# Altium footprint library FootprintHole.PcbLib: 100 footprints (part 6 of 7)
Each footprint in its own frame and in the unit in brackets; x right, y up, seen from the top. Pads: shape width x height; smd on the part's side, far side on the other; paste and mask are expansions set on the pad; w line width, h text height; cw(c..) or ccw(c..) is an arc to the next point about the centre after c.
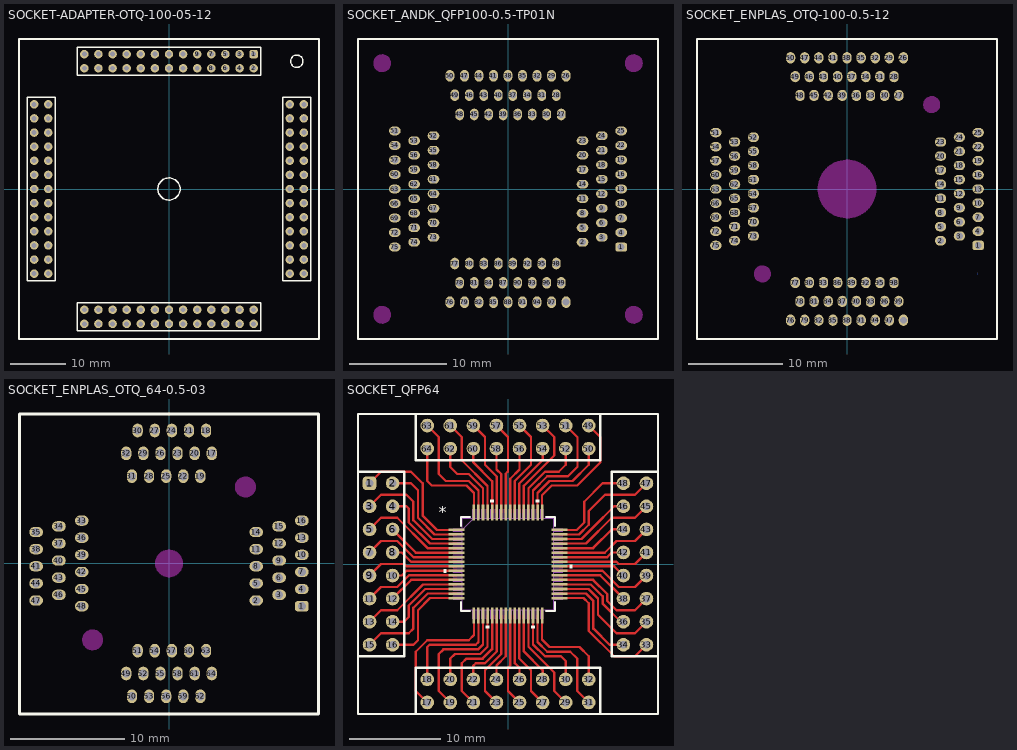
[diagram p5: the footprints below, top view; thin cyan lines are the x and y axes]

## SOCKET-ADAPTER-OTQ-100-05-12 [mil]
pads (104):
  rrect50% 60x60 hole 35: 1(599.99,955.52)
  round 60 hole 35: 2(599.99,855.52) 3(500,955.51) 4(500,855.51) 5(400,955.51) 6(400,855.51) 7(300,955.51) 8(300,855.51) 9(200,955.51) 10(200,855.51) 11(100,955.51) 12(100,855.51) 13(0,955.51) 14(0,855.51) 15(-100,955.51) 16(-100,855.51) 17(-200,955.51) 18(-200,855.51) 19(-300,955.51) 20(-300,855.51) 21(-400,955.51) 22(-400,855.51) 23(-499.99,955.51) 24(-499.99,855.51) 25(-599.99,955.51) 26(-855.52,599.99) 27(-955.51,500) 28(-855.51,500) 29(-955.51,400) 30(-855.51,400) 31(-955.51,300) 32(-855.51,300) 33(-955.51,200) 34(-855.51,200) 35(-955.51,100) 36(-855.51,100) 37(-955.51,0) 38(-855.51,0) 39(-955.51,-100) 40(-855.51,-100) 41(-955.51,-200) 42(-855.51,-200) 43(-955.51,-300) 44(-855.51,-300) 45(-955.51,-400) 46(-855.51,-400) 47(-955.51,-499.99) 48(-855.51,-499.99) 49(-955.51,-599.99) 50(-855.51,-599.99) 51(-599.99,-955.52) 52(-599.99,-855.52) 53(-500,-955.51) 54(-500,-855.51) 55(-400,-955.51) 56(-400,-855.51) 57(-300,-955.51) 58(-300,-855.51) 59(-200,-955.51) 60(-200,-855.51) 61(-100,-955.51) 62(-100,-855.51) 63(0,-955.51) 64(0,-855.51) 65(100,-955.51) 66(100,-855.51) 67(200,-955.51) 68(200,-855.51) 69(300,-955.51) 70(300,-855.51) 71(400,-955.51) 72(400,-855.51) 73(499.99,-955.51) 74(499.99,-855.51) 75(599.99,-955.51) 76(855.52,-599.99) 77(955.51,-500) 78(855.51,-500) 79(955.51,-400) 80(855.51,-400) 81(955.51,-300) 82(855.51,-300) 83(955.51,-200) 84(855.51,-200) 85(955.51,-100) 86(855.51,-100) 87(955.51,0) 88(855.51,0) 89(955.51,100) 90(855.51,100) 91(955.51,200) 92(855.51,200) 93(955.51,300) 94(855.51,300) 95(955.51,400) 96(855.51,400) 97(955.51,499.99) 98(855.51,499.99) 99(955.51,599.99) 100(855.51,599.99) 101(-599.99,855.51) 102(-955.52,599.99) 103(599.99,-855.51) 104(955.52,-599.99)
Top Overlay:
  circle w10: c0,0 r78.74
  circle w10: c905.51,905.51 r44.02
  lines w10: -805.51,650 -805.51,649.99 ; -805.51,650 -1005.51,650 -1005.51,-649.97 -805.51,-649.97 -805.51,649.99 ; -650,-805.51 -649.99,-805.51 ; -649.99,-805.51 649.97,-805.51 649.97,-1005.51 -650,-1005.51 -650,-805.51 ; 650,805.51 650,1005.51 -649.97,1005.51 -649.97,805.51 649.99,805.51 ; 649.99,805.51 650,805.51 ; 805.51,-649.99 805.51,-650 ; 805.51,-649.99 805.51,649.97 1005.51,649.97 1005.51,-650 805.51,-650
  lines w11.81: -1062.99,-1062.99 1062.99,-1062.99 1062.99,1062.99 -1062.99,1062.99 -1062.99,-1062.99
3D body "zl201-1_p2-54_l2-54_w2-54_h8-89.stp": height 350, standoff -120, extent -49.99,805.51 50.01,905.51
3D body "zl201-1_p2-54_l2-54_w2-54_h8-89.stp": height 350, standoff -120, extent -149.99,805.51 -49.99,905.51
3D body "zl201-1_p2-54_l2-54_w2-54_h8-89.stp": height 350, standoff -120, extent 50.01,805.51 150.01,905.51
3D body "zl201-1_p2-54_l2-54_w2-54_h8-89.stp": height 350, standoff -120, extent 150.01,805.51 250.01,905.51
3D body "zl201-1_p2-54_l2-54_w2-54_h8-89.stp": height 350, standoff -120, extent 250.01,805.51 350.01,905.51
3D body "zl201-1_p2-54_l2-54_w2-54_h8-89.stp": height 350, standoff -120, extent 350.01,805.51 450.01,905.51
3D body "zl201-1_p2-54_l2-54_w2-54_h8-89.stp": height 350, standoff -120, extent -149.99,905.51 -49.99,1005.51
3D body "zl201-1_p2-54_l2-54_w2-54_h8-89.stp": height 350, standoff -120, extent -49.99,905.51 50.01,1005.51
3D body "zl201-1_p2-54_l2-54_w2-54_h8-89.stp": height 350, standoff -120, extent 50.01,905.51 150.01,1005.51
3D body "zl201-1_p2-54_l2-54_w2-54_h8-89.stp": height 350, standoff -120, extent 150.01,905.51 250.01,1005.51
3D body "zl201-1_p2-54_l2-54_w2-54_h8-89.stp": height 350, standoff -120, extent 250.01,905.51 350.01,1005.51
3D body "zl201-1_p2-54_l2-54_w2-54_h8-89.stp": height 350, standoff -120, extent 350.02,905.51 450.02,1005.51
3D body "zl201-1_p2-54_l2-54_w2-54_h8-89.stp": height 350, standoff -120, extent 450.01,805.51 550.01,905.51
3D body "zl201-1_p2-54_l2-54_w2-54_h8-89.stp": height 350, standoff -120, extent 450.01,905.51 550.01,1005.51
3D body "zl201-1_p2-54_l2-54_w2-54_h8-89.stp": height 350, standoff -120, extent 550,805.51 650,905.51
3D body "zl201-1_p2-54_l2-54_w2-54_h8-89.stp": height 350, standoff -120, extent 550,905.51 650,1005.51
3D body "zl201-1_p2-54_l2-54_w2-54_h8-89.stp": height 350, standoff -120, extent -249.99,905.51 -149.99,1005.51
3D body "zl201-1_p2-54_l2-54_w2-54_h8-89.stp": height 350, standoff -120, extent -249.99,805.51 -149.99,905.51
3D body "zl201-1_p2-54_l2-54_w2-54_h8-89.stp": height 350, standoff -120, extent -349.99,905.51 -249.99,1005.51
3D body "zl201-1_p2-54_l2-54_w2-54_h8-89.stp": height 350, standoff -120, extent -349.99,805.51 -249.99,905.51
3D body "zl201-1_p2-54_l2-54_w2-54_h8-89.stp": height 350, standoff -120, extent -449.99,905.51 -349.99,1005.51
3D body "zl201-1_p2-54_l2-54_w2-54_h8-89.stp": height 350, standoff -120, extent -449.99,805.51 -349.99,905.51
3D body "zl201-1_p2-54_l2-54_w2-54_h8-89.stp": height 350, standoff -120, extent -549.97,805.5 -449.97,905.5
3D body "zl201-1_p2-54_l2-54_w2-54_h8-89.stp": height 350, standoff -120, extent -549.97,905.51 -449.97,1005.51
3D body "zl201-1_p2-54_l2-54_w2-54_h8-89.stp": height 350, standoff -120, extent -649.97,805.51 -549.97,905.51
3D body "zl201-1_p2-54_l2-54_w2-54_h8-89.stp": height 350, standoff -120, extent -649.97,905.51 -549.97,1005.51
3D body "zl201-1_p2-54_l2-54_w2-54_h8-89.stp": height 350, standoff -120, extent -905.51,-49.99 -805.51,50.01
3D body "zl201-1_p2-54_l2-54_w2-54_h8-89.stp": height 350, standoff -120, extent -905.51,-149.99 -805.51,-49.99
3D body "zl201-1_p2-54_l2-54_w2-54_h8-89.stp": height 350, standoff -120, extent -905.51,50.01 -805.51,150.01
3D body "zl201-1_p2-54_l2-54_w2-54_h8-89.stp": height 350, standoff -120, extent -905.51,150.01 -805.51,250.01
3D body "zl201-1_p2-54_l2-54_w2-54_h8-89.stp": height 350, standoff -120, extent -905.51,250.01 -805.51,350.01
3D body "zl201-1_p2-54_l2-54_w2-54_h8-89.stp": height 350, standoff -120, extent -905.51,350.01 -805.51,450.01
3D body "zl201-1_p2-54_l2-54_w2-54_h8-89.stp": height 350, standoff -120, extent -1005.51,-149.99 -905.51,-49.99
3D body "zl201-1_p2-54_l2-54_w2-54_h8-89.stp": height 350, standoff -120, extent -1005.51,-49.99 -905.51,50.01
3D body "zl201-1_p2-54_l2-54_w2-54_h8-89.stp": height 350, standoff -120, extent -1005.51,50.01 -905.51,150.01
3D body "zl201-1_p2-54_l2-54_w2-54_h8-89.stp": height 350, standoff -120, extent -1005.51,150.01 -905.51,250.01
3D body "zl201-1_p2-54_l2-54_w2-54_h8-89.stp": height 350, standoff -120, extent -1005.51,250.01 -905.51,350.01
3D body "zl201-1_p2-54_l2-54_w2-54_h8-89.stp": height 350, standoff -120, extent -1005.51,350.02 -905.51,450.02
3D body "zl201-1_p2-54_l2-54_w2-54_h8-89.stp": height 350, standoff -120, extent -905.51,450.01 -805.51,550.01
3D body "zl201-1_p2-54_l2-54_w2-54_h8-89.stp": height 350, standoff -120, extent -1005.51,450.01 -905.51,550.01
3D body "zl201-1_p2-54_l2-54_w2-54_h8-89.stp": height 350, standoff -120, extent -905.51,550 -805.51,650
3D body "zl201-1_p2-54_l2-54_w2-54_h8-89.stp": height 350, standoff -120, extent -1005.51,550 -905.51,650
3D body "zl201-1_p2-54_l2-54_w2-54_h8-89.stp": height 350, standoff -120, extent -1005.51,-249.99 -905.51,-149.99
3D body "zl201-1_p2-54_l2-54_w2-54_h8-89.stp": height 350, standoff -120, extent -905.51,-249.99 -805.51,-149.99
3D body "zl201-1_p2-54_l2-54_w2-54_h8-89.stp": height 350, standoff -120, extent -1005.51,-349.99 -905.51,-249.99
3D body "zl201-1_p2-54_l2-54_w2-54_h8-89.stp": height 350, standoff -120, extent -905.51,-349.99 -805.51,-249.99
3D body "zl201-1_p2-54_l2-54_w2-54_h8-89.stp": height 350, standoff -120, extent -1005.51,-449.99 -905.51,-349.99
3D body "zl201-1_p2-54_l2-54_w2-54_h8-89.stp": height 350, standoff -120, extent -905.51,-449.99 -805.51,-349.99
3D body "zl201-1_p2-54_l2-54_w2-54_h8-89.stp": height 350, standoff -120, extent -905.5,-549.97 -805.5,-449.97
3D body "zl201-1_p2-54_l2-54_w2-54_h8-89.stp": height 350, standoff -120, extent -1005.51,-549.97 -905.51,-449.97
3D body "zl201-1_p2-54_l2-54_w2-54_h8-89.stp": height 350, standoff -120, extent -905.51,-649.97 -805.51,-549.97
3D body "zl201-1_p2-54_l2-54_w2-54_h8-89.stp": height 350, standoff -120, extent -1005.51,-649.97 -905.51,-549.97
3D body "zl201-1_p2-54_l2-54_w2-54_h8-89.stp": height 350, standoff -120, extent 549.97,-1005.51 649.97,-905.51
3D body "zl201-1_p2-54_l2-54_w2-54_h8-89.stp": height 350, standoff -120, extent 549.97,-905.51 649.97,-805.51
3D body "zl201-1_p2-54_l2-54_w2-54_h8-89.stp": height 350, standoff -120, extent 449.97,-1005.51 549.97,-905.51
3D body "zl201-1_p2-54_l2-54_w2-54_h8-89.stp": height 350, standoff -120, extent 449.97,-905.5 549.97,-805.5
3D body "zl201-1_p2-54_l2-54_w2-54_h8-89.stp": height 350, standoff -120, extent 349.99,-905.51 449.99,-805.51
3D body "zl201-1_p2-54_l2-54_w2-54_h8-89.stp": height 350, standoff -120, extent 349.99,-1005.51 449.99,-905.51
3D body "zl201-1_p2-54_l2-54_w2-54_h8-89.stp": height 350, standoff -120, extent 249.99,-905.51 349.99,-805.51
3D body "zl201-1_p2-54_l2-54_w2-54_h8-89.stp": height 350, standoff -120, extent 249.99,-1005.51 349.99,-905.51
3D body "zl201-1_p2-54_l2-54_w2-54_h8-89.stp": height 350, standoff -120, extent 149.99,-905.51 249.99,-805.51
3D body "zl201-1_p2-54_l2-54_w2-54_h8-89.stp": height 350, standoff -120, extent 149.99,-1005.51 249.99,-905.51
3D body "zl201-1_p2-54_l2-54_w2-54_h8-89.stp": height 350, standoff -120, extent -650,-1005.51 -550,-905.51
3D body "zl201-1_p2-54_l2-54_w2-54_h8-89.stp": height 350, standoff -120, extent -650,-905.51 -550,-805.51
3D body "zl201-1_p2-54_l2-54_w2-54_h8-89.stp": height 350, standoff -120, extent -550.01,-1005.51 -450.01,-905.51
3D body "zl201-1_p2-54_l2-54_w2-54_h8-89.stp": height 350, standoff -120, extent -550.01,-905.51 -450.01,-805.51
3D body "zl201-1_p2-54_l2-54_w2-54_h8-89.stp": height 350, standoff -120, extent -450.02,-1005.51 -350.02,-905.51
3D body "zl201-1_p2-54_l2-54_w2-54_h8-89.stp": height 350, standoff -120, extent -350.01,-1005.51 -250.01,-905.51
3D body "zl201-1_p2-54_l2-54_w2-54_h8-89.stp": height 350, standoff -120, extent -250.01,-1005.51 -150.01,-905.51
3D body "zl201-1_p2-54_l2-54_w2-54_h8-89.stp": height 350, standoff -120, extent -150.01,-1005.51 -50.01,-905.51
3D body "zl201-1_p2-54_l2-54_w2-54_h8-89.stp": height 350, standoff -120, extent -50.01,-1005.51 49.99,-905.51
3D body "zl201-1_p2-54_l2-54_w2-54_h8-89.stp": height 350, standoff -120, extent 49.99,-1005.51 149.99,-905.51
3D body "zl201-1_p2-54_l2-54_w2-54_h8-89.stp": height 350, standoff -120, extent -450.01,-905.51 -350.01,-805.51
3D body "zl201-1_p2-54_l2-54_w2-54_h8-89.stp": height 350, standoff -120, extent -350.01,-905.51 -250.01,-805.51
3D body "zl201-1_p2-54_l2-54_w2-54_h8-89.stp": height 350, standoff -120, extent -250.01,-905.51 -150.01,-805.51
3D body "zl201-1_p2-54_l2-54_w2-54_h8-89.stp": height 350, standoff -120, extent -150.01,-905.51 -50.01,-805.51
3D body "zl201-1_p2-54_l2-54_w2-54_h8-89.stp": height 350, standoff -120, extent 49.99,-905.51 149.99,-805.51
3D body "zl201-1_p2-54_l2-54_w2-54_h8-89.stp": height 350, standoff -120, extent -50.01,-905.51 49.99,-805.51
3D body "zl201-1_p2-54_l2-54_w2-54_h8-89.stp": height 350, standoff -120, extent 905.51,549.97 1005.51,649.97
3D body "zl201-1_p2-54_l2-54_w2-54_h8-89.stp": height 350, standoff -120, extent 805.51,549.97 905.51,649.97
3D body "zl201-1_p2-54_l2-54_w2-54_h8-89.stp": height 350, standoff -120, extent 905.51,449.97 1005.51,549.97
3D body "zl201-1_p2-54_l2-54_w2-54_h8-89.stp": height 350, standoff -120, extent 805.5,449.97 905.5,549.97
3D body "zl201-1_p2-54_l2-54_w2-54_h8-89.stp": height 350, standoff -120, extent 805.51,349.99 905.51,449.99
3D body "zl201-1_p2-54_l2-54_w2-54_h8-89.stp": height 350, standoff -120, extent 905.51,349.99 1005.51,449.99
3D body "zl201-1_p2-54_l2-54_w2-54_h8-89.stp": height 350, standoff -120, extent 805.51,249.99 905.51,349.99
3D body "zl201-1_p2-54_l2-54_w2-54_h8-89.stp": height 350, standoff -120, extent 905.51,249.99 1005.51,349.99
3D body "zl201-1_p2-54_l2-54_w2-54_h8-89.stp": height 350, standoff -120, extent 805.51,149.99 905.51,249.99
3D body "zl201-1_p2-54_l2-54_w2-54_h8-89.stp": height 350, standoff -120, extent 905.51,149.99 1005.51,249.99
3D body "zl201-1_p2-54_l2-54_w2-54_h8-89.stp": height 350, standoff -120, extent 905.51,-650 1005.51,-550
3D body "zl201-1_p2-54_l2-54_w2-54_h8-89.stp": height 350, standoff -120, extent 805.51,-650 905.51,-550
3D body "zl201-1_p2-54_l2-54_w2-54_h8-89.stp": height 350, standoff -120, extent 905.51,-550.01 1005.51,-450.01
3D body "zl201-1_p2-54_l2-54_w2-54_h8-89.stp": height 350, standoff -120, extent 805.51,-550.01 905.51,-450.01
3D body "zl201-1_p2-54_l2-54_w2-54_h8-89.stp": height 350, standoff -120, extent 905.51,-450.02 1005.51,-350.02
3D body "zl201-1_p2-54_l2-54_w2-54_h8-89.stp": height 350, standoff -120, extent 905.51,-350.01 1005.51,-250.01
3D body "zl201-1_p2-54_l2-54_w2-54_h8-89.stp": height 350, standoff -120, extent 905.51,-250.01 1005.51,-150.01
3D body "zl201-1_p2-54_l2-54_w2-54_h8-89.stp": height 350, standoff -120, extent 905.51,-150.01 1005.51,-50.01
3D body "zl201-1_p2-54_l2-54_w2-54_h8-89.stp": height 350, standoff -120, extent 905.51,-50.01 1005.51,49.99
3D body "zl201-1_p2-54_l2-54_w2-54_h8-89.stp": height 350, standoff -120, extent 905.51,49.99 1005.51,149.99
3D body "zl201-1_p2-54_l2-54_w2-54_h8-89.stp": height 350, standoff -120, extent 805.51,-450.01 905.51,-350.01
3D body "zl201-1_p2-54_l2-54_w2-54_h8-89.stp": height 350, standoff -120, extent 805.51,-350.01 905.51,-250.01
3D body "zl201-1_p2-54_l2-54_w2-54_h8-89.stp": height 350, standoff -120, extent 805.51,-250.01 905.51,-150.01
3D body "zl201-1_p2-54_l2-54_w2-54_h8-89.stp": height 350, standoff -120, extent 805.51,-150.01 905.51,-50.01
3D body "zl201-1_p2-54_l2-54_w2-54_h8-89.stp": height 350, standoff -120, extent 805.51,49.99 905.51,149.99
3D body "zl201-1_p2-54_l2-54_w2-54_h8-89.stp": height 350, standoff -120, extent 805.51,-50.01 905.51,49.99

## SOCKET_ANDK_QFP100-0.5-TP01N [mm]
pads (100):
  rrect50% 1.2x0.9 hole 0.72: 1(11.7,-6)
  oval 1.2x0.9 hole 0.72: 2(7.7,-5.5) 3(9.7,-5) 4(11.7,-4.5) 5(7.7,-4) 6(9.7,-3.5) 7(11.7,-3) 8(7.7,-2.5) 9(9.7,-2) 10(11.7,-1.5) 11(7.7,-1) 12(9.7,-0.5) 13(11.7,0) 14(7.7,0.5) 15(9.7,1) 16(11.7,1.5) 17(7.7,2) 18(9.7,2.5) 19(11.7,3) 20(7.7,3.5) 21(9.7,4) 22(11.7,4.5) 23(7.7,5) 24(9.7,5.5) 25(11.7,6) 51(-11.7,6) 52(-7.7,5.5) 53(-9.7,5) 54(-11.7,4.5) 55(-7.7,4) 56(-9.7,3.5) 57(-11.7,3) 58(-7.7,2.5) 59(-9.7,2) 60(-11.7,1.5) 61(-7.7,1) 62(-9.7,0.5) 63(-11.7,0) 64(-7.7,-0.5) 65(-9.7,-1) 66(-11.7,-1.5) 67(-7.7,-2) 68(-9.7,-2.5) 69(-11.7,-3) 70(-7.7,-3.5) 71(-9.7,-4) 72(-11.7,-4.5) 73(-7.7,-5) 74(-9.7,-5.5) 75(-11.7,-6)
  oval 0.9x1.2 hole 0.72: 26(6,11.7) 27(5.5,7.7) 28(5,9.7) 29(4.5,11.7) 30(4,7.7) 31(3.5,9.7) 32(3,11.7) 33(2.5,7.7) 34(2,9.7) 35(1.5,11.7) 36(1,7.7) 37(0.5,9.7) 38(0,11.7) 39(-0.5,7.7) 40(-1,9.7) 41(-1.5,11.7) 42(-2,7.7) 43(-2.5,9.7) 44(-3,11.7) 45(-3.5,7.7) 46(-4,9.7) 47(-4.5,11.7) 48(-5,7.7) 49(-5.5,9.7) 50(-6,11.7) 76(-6,-11.7) 77(-5.5,-7.7) 78(-5,-9.7) 79(-4.5,-11.7) 80(-4,-7.7) 81(-3.5,-9.7) 82(-3,-11.7) 83(-2.5,-7.7) 84(-2,-9.7) 85(-1.5,-11.7) 86(-1,-7.7) 87(-0.5,-9.7) 88(0,-11.7) 89(0.5,-7.7) 90(1,-9.7) 91(1.5,-11.7) 92(2,-7.7) 93(2.5,-9.7) 94(3,-11.7) 95(3.5,-7.7) 96(4,-9.7) 97(4.5,-11.7) 98(5,-7.7) 99(5.5,-9.7) 100(6,-11.7)
Top Overlay:
  lines w0.254: -15.5,-15.5 -15.5,15.5 15.5,15.5 15.5,-15.5 -15.5,-15.5
Keep-Out Layer:
  board cut-out: -13,-13.8 -13.079,-13.8 -13.233,-13.769 -13.379,-13.709 -13.51,-13.621 -13.621,-13.51 -13.709,-13.379 -13.769,-13.233 -13.8,-13.079 -13.8,-13 -13.8,-12.921 -13.769,-12.767 -13.709,-12.621 -13.621,-12.49 -13.51,-12.379 -13.379,-12.291 -13.233,-12.231 -13.079,-12.2 -13,-12.2 -12.921,-12.2 -12.767,-12.231 -12.621,-12.291 -12.49,-12.379 -12.379,-12.49 -12.291,-12.621 -12.231,-12.767 -12.2,-12.921 -12.2,-13 -12.2,-13.079 -12.231,-13.233 -12.291,-13.379 -12.379,-13.51 -12.49,-13.621 -12.621,-13.709 -12.767,-13.769 -12.921,-13.8
  board cut-out: 12.2,-13 12.2,-13.079 12.231,-13.233 12.291,-13.379 12.379,-13.51 12.49,-13.621 12.621,-13.709 12.767,-13.769 12.921,-13.8 13,-13.8 13.079,-13.8 13.233,-13.769 13.379,-13.709 13.51,-13.621 13.621,-13.51 13.709,-13.379 13.769,-13.233 13.8,-13.079 13.8,-13 13.8,-12.921 13.769,-12.767 13.709,-12.621 13.621,-12.49 13.51,-12.379 13.379,-12.291 13.233,-12.231 13.079,-12.2 13,-12.2 12.921,-12.2 12.767,-12.231 12.621,-12.291 12.49,-12.379 12.379,-12.49 12.291,-12.621 12.231,-12.767 12.2,-12.921
  board cut-out: 13,12.2 12.921,12.2 12.767,12.231 12.621,12.291 12.49,12.379 12.379,12.49 12.291,12.621 12.231,12.767 12.2,12.921 12.2,13 12.2,13.079 12.231,13.233 12.291,13.379 12.379,13.51 12.49,13.621 12.621,13.709 12.767,13.769 12.921,13.8 13,13.8 13.079,13.8 13.233,13.769 13.379,13.709 13.51,13.621 13.621,13.51 13.709,13.379 13.769,13.233 13.8,13.079 13.8,13 13.8,12.921 13.769,12.767 13.709,12.621 13.621,12.49 13.51,12.379 13.379,12.291 13.233,12.231 13.079,12.2
  board cut-out: -13,12.2 -13.079,12.2 -13.233,12.231 -13.379,12.291 -13.51,12.379 -13.621,12.49 -13.709,12.621 -13.769,12.767 -13.8,12.921 -13.8,13 -13.8,13.079 -13.769,13.233 -13.709,13.379 -13.621,13.51 -13.51,13.621 -13.379,13.709 -13.233,13.769 -13.079,13.8 -13,13.8 -12.921,13.8 -12.767,13.769 -12.621,13.709 -12.49,13.621 -12.379,13.51 -12.291,13.379 -12.231,13.233 -12.2,13.079 -12.2,13 -12.2,12.921 -12.231,12.767 -12.291,12.621 -12.379,12.49 -12.49,12.379 -12.621,12.291 -12.767,12.231 -12.921,12.2
Keep-Out Layer:
  circle w0.254: c-13,-13 r0.8
  circle w0.254: c13,-13 r0.8
  circle w0.254: c13,13 r0.8
  circle w0.254: c-13,13 r0.8

## SOCKET_ENPLAS_OTQ-100-0.5-12 [mm]
pads (100):
  rrect50% 1.2x1 hole 0.72: 1(13.95,-6)
  oval 1.2x1 hole 0.72: 2(9.95,-5.5) 3(11.95,-5) 4(13.95,-4.5) 5(9.95,-4) 6(11.95,-3.5) 7(13.95,-3) 8(9.95,-2.5) 9(11.95,-2) 10(13.95,-1.5) 11(9.95,-1) 12(11.95,-0.5) 13(13.95,0) 14(9.95,0.5) 15(11.95,1) 16(13.95,1.5) 17(9.95,2) 18(11.95,2.5) 19(13.95,3) 20(9.95,3.5) 21(11.95,4) 22(13.95,4.5) 23(9.95,5) 24(11.95,5.5) 25(13.95,6) 51(-13.95,6) 52(-9.95,5.5) 53(-11.95,5) 54(-13.95,4.5) 55(-9.95,4) 56(-11.95,3.5) 57(-13.95,3) 58(-9.95,2.5) 59(-11.95,2) 60(-13.95,1.5) 61(-9.95,1) 62(-11.95,0.5) 63(-13.95,0) 64(-9.95,-0.5) 65(-11.95,-1) 66(-13.95,-1.5) 67(-9.95,-2) 68(-11.95,-2.5) 69(-13.95,-3) 70(-9.95,-3.5) 71(-11.95,-4) 72(-13.95,-4.5) 73(-9.95,-5) 74(-11.95,-5.5) 75(-13.95,-6)
  oval 1x1.2 hole 0.72: 26(6,13.95) 27(5.5,9.95) 28(5,11.95) 29(4.5,13.95) 30(4,9.95) 31(3.5,11.95) 32(3,13.95) 33(2.5,9.95) 34(2,11.95) 35(1.5,13.95) 36(1,9.95) 37(0.5,11.95) 38(0,13.95) 39(-0.5,9.95) 40(-1,11.95) 41(-1.5,13.95) 42(-2,9.95) 43(-2.5,11.95) 44(-3,13.95) 45(-3.5,9.95) 46(-4,11.95) 47(-4.5,13.95) 48(-5,9.95) 49(-5.5,11.95) 50(-6,13.95) 76(-6,-13.95) 77(-5.5,-9.95) 78(-5,-11.95) 79(-4.5,-13.95) 80(-4,-9.95) 81(-3.5,-11.95) 82(-3,-13.95) 83(-2.5,-9.95) 84(-2,-11.95) 85(-1.5,-13.95) 86(-1,-9.95) 87(-0.5,-11.95) 88(0,-13.95) 89(0.5,-9.95) 90(1,-11.95) 91(1.5,-13.95) 92(2,-9.95) 93(2.5,-11.95) 94(3,-13.95) 95(3.5,-9.95) 96(4,-11.95) 97(4.5,-13.95) 98(5,-9.95) 99(5.5,-11.95) 100(6,-13.95)
Bottom Layer:
  region: 13.9,-8.889 13.9,-9.139
Top Overlay:
  lines w0.254: -15.95,-15.95 15.95,-15.95 15.95,15.95 -15.95,15.95 -15.95,-15.95
Keep-Out Layer:
  board cut-out: -9,-9.8 -9.079,-9.8 -9.233,-9.769 -9.379,-9.709 -9.51,-9.621 -9.621,-9.51 -9.709,-9.379 -9.769,-9.233 -9.8,-9.079 -9.8,-9 -9.8,-8.921 -9.769,-8.767 -9.709,-8.621 -9.621,-8.49 -9.51,-8.379 -9.379,-8.291 -9.233,-8.231 -9.079,-8.2 -9,-8.2 -8.921,-8.2 -8.767,-8.231 -8.621,-8.291 -8.49,-8.379 -8.379,-8.49 -8.291,-8.621 -8.231,-8.767 -8.2,-8.921 -8.2,-9 -8.2,-9.079 -8.231,-9.233 -8.291,-9.379 -8.379,-9.51 -8.49,-9.621 -8.621,-9.709 -8.767,-9.769 -8.921,-9.8
  board cut-out: 0,-3 -0.197,-3 -0.587,-2.949 -0.966,-2.847 -1.33,-2.696 -1.67,-2.5 -1.982,-2.26 -2.26,-1.982 -2.5,-1.67 -2.696,-1.33 -2.847,-0.966 -2.949,-0.587 -3,-0.197 -3,0 -3,0.197 -2.949,0.587 -2.847,0.966 -2.696,1.33 -2.5,1.67 -2.26,1.982 -1.982,2.26 -1.67,2.5 -1.33,2.696 -0.966,2.847 -0.587,2.949 -0.197,3 0,3 0.197,3 0.587,2.949 0.966,2.847 1.33,2.696 1.67,2.5 1.982,2.26 2.26,1.982 2.5,1.67 2.696,1.33 2.847,0.966 2.949,0.587 3,0.197 3,0 3,-0.197 2.949,-0.587 2.847,-0.966 2.696,-1.33 2.5,-1.67 2.26,-1.982 1.982,-2.26 1.67,-2.5 1.33,-2.696 0.966,-2.847 0.587,-2.949 0.197,-3
  board cut-out: 9,8.2 8.921,8.2 8.767,8.231 8.621,8.291 8.49,8.379 8.379,8.49 8.291,8.621 8.231,8.767 8.2,8.921 8.2,9 8.2,9.079 8.231,9.233 8.291,9.379 8.379,9.51 8.49,9.621 8.621,9.709 8.767,9.769 8.921,9.8 9,9.8 9.079,9.8 9.233,9.769 9.379,9.709 9.51,9.621 9.621,9.51 9.709,9.379 9.769,9.233 9.8,9.079 9.8,9 9.8,8.921 9.769,8.767 9.709,8.621 9.621,8.49 9.51,8.379 9.379,8.291 9.233,8.231 9.079,8.2
Keep-Out Layer:
  circle w0.254: c0,0 r3
  circle w0.254: c-9,-9.025 r0.786
  circle w0.254: c9,8.975 r0.786

## SOCKET_ENPLAS_OTQ_64-0.5-03 [mm]
pads (64):
  rrect50% 1.2x0.9 hole 0.72: 1(11.65,-3.75)
  oval 1.2x0.9 hole 0.72: 2(7.65,-3.25) 3(9.65,-2.75) 4(11.65,-2.25) 5(7.65,-1.75) 6(9.65,-1.25) 7(11.65,-0.75) 8(7.65,-0.25) 9(9.65,0.25) 10(11.65,0.75) 11(7.65,1.25) 12(9.65,1.75) 13(11.65,2.25) 14(7.65,2.75) 15(9.65,3.25) 16(11.65,3.75) 33(-7.65,3.75) 34(-9.65,3.25) 35(-11.65,2.75) 36(-7.65,2.25) 37(-9.65,1.75) 38(-11.65,1.25) 39(-7.65,0.75) 40(-9.65,0.25) 41(-11.65,-0.25) 42(-7.65,-0.75) 43(-9.65,-1.25) 44(-11.65,-1.75) 45(-7.65,-2.25) 46(-9.65,-2.75) 47(-11.65,-3.25) 48(-7.65,-3.75)
  oval 0.9x1.2 hole 0.72: 17(3.75,9.65) 18(3.25,11.65) 19(2.75,7.65) 20(2.25,9.65) 21(1.75,11.65) 22(1.25,7.65) 23(0.75,9.65) 24(0.25,11.65) 25(-0.25,7.65) 26(-0.75,9.65) 27(-1.25,11.65) 28(-1.75,7.65) 29(-2.25,9.65) 30(-2.75,11.65) 31(-3.25,7.65) 32(-3.75,9.65) 49(-3.75,-9.65) 50(-3.25,-11.65) 51(-2.75,-7.65) 52(-2.25,-9.65) 53(-1.75,-11.65) 54(-1.25,-7.65) 55(-0.75,-9.65) 56(-0.25,-11.65) 57(0.25,-7.65) 58(0.75,-9.65) 59(1.25,-11.65) 60(1.75,-7.65) 61(2.25,-9.65) 62(2.75,-11.65) 63(3.25,-7.65) 64(3.75,-9.65)
Top Overlay:
  lines w0.254: -13.1,-13.2 -13.1,-11.65 -13.1,13.1 0,13.1 13.1,13.1 13.1,-13.2 -13.1,-13.2
Keep-Out Layer:
  board cut-out: 0,-1.1 -0.108,-1.1 -0.321,-1.058 -0.521,-0.975 -0.701,-0.854 -0.854,-0.701 -0.975,-0.521 -1.058,-0.321 -1.1,-0.108 -1.1,0 -1.1,0.108 -1.058,0.321 -0.975,0.521 -0.854,0.701 -0.701,0.854 -0.521,0.975 -0.321,1.058 -0.108,1.1 0,1.1 0.108,1.1 0.321,1.058 0.521,0.975 0.701,0.854 0.854,0.701 0.975,0.521 1.058,0.321 1.1,0.108 1.1,0 1.1,-0.108 1.058,-0.321 0.975,-0.521 0.854,-0.701 0.701,-0.854 0.521,-0.975 0.321,-1.058 0.108,-1.1
  board cut-out: 6.7,5.9 6.621,5.9 6.467,5.931 6.321,5.991 6.19,6.079 6.079,6.19 5.991,6.321 5.931,6.467 5.9,6.621 5.9,6.7 5.9,6.779 5.931,6.933 5.991,7.079 6.079,7.21 6.19,7.321 6.321,7.409 6.467,7.469 6.621,7.5 6.7,7.5 6.779,7.5 6.933,7.469 7.079,7.409 7.21,7.321 7.321,7.21 7.409,7.079 7.469,6.933 7.5,6.779 7.5,6.7 7.5,6.621 7.469,6.467 7.409,6.321 7.321,6.19 7.21,6.079 7.079,5.991 6.933,5.931 6.779,5.9
  board cut-out: -6.7,-7.5 -6.779,-7.5 -6.933,-7.469 -7.079,-7.409 -7.21,-7.321 -7.321,-7.21 -7.409,-7.079 -7.469,-6.933 -7.5,-6.779 -7.5,-6.7 -7.5,-6.621 -7.469,-6.467 -7.409,-6.321 -7.321,-6.19 -7.21,-6.079 -7.079,-5.991 -6.933,-5.931 -6.779,-5.9 -6.7,-5.9 -6.621,-5.9 -6.467,-5.931 -6.321,-5.991 -6.19,-6.079 -6.079,-6.19 -5.991,-6.321 -5.931,-6.467 -5.9,-6.621 -5.9,-6.7 -5.9,-6.779 -5.931,-6.933 -5.991,-7.079 -6.079,-7.21 -6.19,-7.321 -6.321,-7.409 -6.467,-7.469 -6.621,-7.5
Keep-Out Layer:
  circle w0.254: c-6.7,-6.7 r0.8
  circle w0.254: c6.7,6.7 r0.8
  circle w0.254: c0,0 r1.1

## SOCKET_QFP64 [mm]
pads (128):
  rrect50% 1.5x1.5 hole 0.85: 1(-15.24,8.89)
  rect 1.778x0.279 smd paste+0 mask+0: 1(-5.677,3.75) 2(-5.677,3.25) 3(-5.677,2.75) 4(-5.677,2.25) 5(-5.677,1.75) 6(-5.677,1.25) 7(-5.677,0.75) 8(-5.677,0.25) 9(-5.677,-0.25) 10(-5.677,-0.75) 11(-5.677,-1.25) 12(-5.677,-1.75) 13(-5.677,-2.25) 14(-5.677,-2.75) 15(-5.677,-3.25) 16(-5.677,-3.75) 33(5.677,-3.75) 34(5.677,-3.25) 35(5.677,-2.75) 36(5.677,-2.25) 37(5.677,-1.75) 38(5.677,-1.25) 39(5.677,-0.75) 40(5.677,-0.25) 41(5.677,0.25) 42(5.677,0.75) 43(5.677,1.25) 44(5.677,1.75) 45(5.677,2.25) 46(5.677,2.75) 47(5.677,3.25) 48(5.677,3.75)
  round 1.5 hole 0.85: 2(-12.7,8.89) 3(-15.24,6.35) 4(-12.7,6.35) 5(-15.24,3.81) 6(-12.7,3.81) 7(-15.24,1.27) 8(-12.7,1.27) 9(-15.24,-1.27) 10(-12.7,-1.27) 11(-15.24,-3.81) 12(-12.7,-3.81) 13(-15.24,-6.35) 14(-12.7,-6.35) 15(-15.24,-8.89) 16(-12.7,-8.89) 17(-8.89,-15.24) 18(-8.89,-12.7) 19(-6.35,-15.24) 20(-6.35,-12.7) 21(-3.81,-15.24) 22(-3.81,-12.7) 23(-1.27,-15.24) 24(-1.27,-12.7) 25(1.27,-15.24) 26(1.27,-12.7) 27(3.81,-15.24) 28(3.81,-12.7) 29(6.35,-15.24) 30(6.35,-12.7) 31(8.89,-15.24) 32(8.89,-12.7) 33(15.24,-8.89) 34(12.7,-8.89) 35(15.24,-6.35) 36(12.7,-6.35) 37(15.24,-3.81) 38(12.7,-3.81) 39(15.24,-1.27) 40(12.7,-1.27) 41(15.24,1.27) 42(12.7,1.27) 43(15.24,3.81) 44(12.7,3.81) 45(15.24,6.35) 46(12.7,6.35) 47(15.24,8.89) 48(12.7,8.89) 49(8.89,15.24) 50(8.89,12.7) 51(6.35,15.24) 52(6.35,12.7) 53(3.81,15.24) 54(3.81,12.7) 55(1.27,15.24) 56(1.27,12.7) 57(-1.27,15.24) 58(-1.27,12.7) 59(-3.81,15.24) 60(-3.81,12.7) 61(-6.35,15.24) 62(-6.35,12.7) 63(-8.89,15.24) 64(-8.89,12.7)
  rect 0.279x1.778 smd paste+0 mask+0: 17(-3.75,-5.677) 18(-3.25,-5.677) 19(-2.75,-5.677) 20(-2.25,-5.677) 21(-1.75,-5.677) 22(-1.25,-5.677) 23(-0.75,-5.677) 24(-0.25,-5.677) 25(0.25,-5.677) 26(0.75,-5.677) 27(1.25,-5.677) 28(1.75,-5.677) 29(2.25,-5.677) 30(2.75,-5.677) 31(3.25,-5.677) 32(3.75,-5.677) 49(3.75,5.677) 50(3.25,5.677) 51(2.75,5.677) 52(2.25,5.677) 53(1.75,5.677) 54(1.25,5.677) 55(0.75,5.677) 56(0.25,5.677) 57(-0.25,5.677) 58(-0.75,5.677) 59(-1.25,5.677) 60(-1.75,5.677) 61(-2.25,5.677) 62(-2.75,5.677) 63(-3.25,5.677) 64(-3.75,5.677)
Top Layer:
  lines w0.254: -15.24,-8.89 -13.97,-7.62 -10.922,-7.62 -10.414,-7.112 -10.414,-4.826 -8.838,-3.25 -5.677,-3.25 ; -15.24,-6.35 -13.97,-5.08 -12.192,-5.08 -9.362,-2.25 -5.677,-2.25 ; -15.24,-3.81 -13.97,-2.54 -12.192,-2.54 -10.902,-1.25 -5.677,-1.25 ; -15.24,-1.27 -13.97,0 -11.43,0 -11.176,-0.254 -5.681,-0.254 -5.677,-0.25 ; -15.24,1.27 -13.97,2.54 -12.192,2.54 -10.402,0.75 -5.677,0.75 ; -15.24,3.81 -13.97,5.08 -12.192,5.08 -8.862,1.75 -5.677,1.75 ; -15.24,6.35 -13.97,7.62 -11.176,7.62 -10.414,6.858 -10.414,4.826 -8.338,2.75 -5.677,2.75 ; -15.24,8.89 -13.97,10.16 -10.668,10.16 -9.398,8.89 -9.398,5.334 -7.814,3.75 -5.677,3.75 ; -12.7,-8.89 -10.414,-8.89 -9.906,-8.382 -9.906,-5.08 -8.576,-3.75 -5.677,-3.75 ; -12.7,-6.35 -11.684,-6.35 ; -12.7,-3.81 -10.64,-1.75 -5.677,-1.75 ; -12.7,-1.27 -11.684,-1.27 -11.164,-0.75 -5.677,-0.75 ; -12.7,1.27 -11.684,1.27 -10.664,0.25 -5.677,0.25 ; -12.7,3.81 -10.14,1.25 -5.677,1.25 ; -12.7,6.35 -11.176,6.35 -10.922,6.096 -10.922,4.572 -8.6,2.25 -5.677,2.25 ; -12.7,8.89 -10.668,8.89 -9.906,8.128 -9.906,5.08 -8.076,3.25 -5.677,3.25 ; -8.89,-15.24 -10.16,-13.97 -10.16,-9.652 -8.89,-8.382 -4.318,-8.382 -3.75,-7.814 -3.75,-5.677 ; -8.89,-12.7 -8.89,-9.144 -8.636,-8.89 -3.556,-8.89 -3.25,-8.584 -3.25,-5.677 ; -8.89,12.7 -8.89,9.144 -8.382,8.636 -4.572,8.636 -3.75,7.814 -3.75,5.677 ; -8.89,15.24 -7.62,13.97 -7.62,9.906 -6.858,9.144 -4.318,9.144 -3.25,8.076 -3.25,5.677 ; -6.35,-15.24 -7.62,-13.97 -7.62,-9.906 -7.112,-9.398 -3.302,-9.398 -2.75,-8.846 -2.75,-5.677 ; -6.35,-12.7 -6.35,-10.414 -5.842,-9.906 -3.048,-9.906 -2.25,-9.108 -2.25,-5.677 ; -6.35,12.7 -6.35,10.668 -5.588,9.906 -4.318,9.906 -2.75,8.338 -2.75,5.677 ; -6.35,15.24 -5.08,13.97 -5.08,11.43 -2.25,8.6 -2.25,5.677 ; -5.677,-2.75 -9.1,-2.75 -10.922,-4.572 -10.922,-5.842 -11.43,-6.35 -11.684,-6.35 ; -3.81,-15.24 -5.08,-13.97 -5.08,-10.922 -4.572,-10.414 -2.794,-10.414 -1.75,-9.37 -1.75,-5.677 ; -3.81,-12.7 -3.81,-11.176 -3.556,-10.922 -2.54,-10.922 -1.25,-9.632 -1.25,-5.677 ; -3.81,12.7 -3.81,11.176 -1.75,9.116 -1.75,5.677 ; -3.81,15.24 -2.54,13.97 -2.54,10.922 -1.25,9.632 -1.25,5.677 ; -1.27,-15.24 -2.54,-13.97 -2.54,-11.684 -0.75,-9.894 -0.75,-5.677 ; -1.27,-12.7 -1.27,-11.176 -0.25,-10.156 -0.25,-5.677 ; -1.27,12.7 -1.27,10.414 -0.75,9.894 -0.75,5.677 ; -1.27,15.24 0,13.97 0,10.185 -0.25,9.935 -0.25,5.677 ; 0.25,-5.677 0.25,-11.18 0,-11.43 0,-13.97 1.27,-15.24 ; 0.25,5.677 0.25,9.394 1.27,10.414 1.27,12.7 ; 0.75,-5.677 0.75,-10.91 1.27,-11.43 1.27,-12.7 ; 0.75,5.677 0.75,9.132 2.54,10.922 2.54,13.97 1.27,15.24 ; 1.25,-5.677 1.25,-10.394 2.54,-11.684 2.54,-13.97 3.81,-15.24 ; 1.25,5.677 1.25,8.87 3.81,11.43 3.81,12.7 ; 1.75,-5.677 1.75,-9.624 3.81,-11.684 3.81,-12.7 ; 1.75,5.677 1.75,8.608 5.105,11.963 5.105,13.945 3.81,15.24 ; 2.25,-5.677 2.25,-9.108 5.08,-11.938 5.08,-13.97 6.35,-15.24 ; 2.25,5.677 2.25,8.346 4.064,10.16 5.588,10.16 6.35,10.922 6.35,12.7 ; 2.75,-5.677 2.75,-8.846 4.064,-10.16 5.842,-10.16 6.35,-10.668 6.35,-12.7 ; 2.75,5.677 2.75,8.084 4.318,9.652 6.604,9.652 7.645,10.693 7.645,13.945 6.35,15.24 ; 3.25,-5.677 3.25,-8.584 4.318,-9.652 6.858,-9.652 7.62,-10.414 7.62,-13.97 8.89,-15.24 ; 3.25,5.677 3.25,7.822 4.572,9.144 7.112,9.144 8.89,10.922 8.89,12.7 ; 3.75,-5.677 3.75,-8.322 4.572,-9.144 7.874,-9.144 8.89,-10.16 8.89,-12.7 ; 3.75,5.677 3.75,7.56 4.826,8.636 7.62,8.636 10.16,11.176 10.16,13.97 8.89,15.24 ; 5.677,-3.75 8.322,-3.75 8.89,-4.318 8.89,-7.366 11.684,-10.16 13.97,-10.16 15.24,-8.89 ; 5.677,-3.25 8.584,-3.25 9.398,-4.064 9.398,-7.112 11.176,-8.89 12.7,-8.89 ; 5.677,-2.75 8.846,-2.75 9.906,-3.81 9.906,-5.588 11.938,-7.62 13.97,-7.62 15.24,-6.35 ; 5.677,-2.25 9.108,-2.25 10.414,-3.556 10.414,-4.349 12.415,-6.35 12.7,-6.35 ; 5.677,-1.75 9.37,-1.75 10.922,-3.302 10.922,-4.064 11.938,-5.08 13.97,-5.08 15.24,-3.81 ; 5.677,-1.25 10.14,-1.25 12.7,-3.81 ; 5.677,-0.75 10.402,-0.75 12.192,-2.54 13.97,-2.54 15.24,-1.27 ; 5.677,-0.25 11.68,-0.25 12.7,-1.27 ; 5.677,0.25 11.942,0.25 12.192,0 13.97,0 15.24,1.27 ; 5.677,0.75 10.91,0.75 11.43,1.27 12.7,1.27 ; 5.677,1.25 10.648,1.25 11.938,2.54 13.97,2.54 15.24,3.81 ; 5.677,1.75 9.37,1.75 11.43,3.81 12.7,3.81 ; 5.677,2.25 8.6,2.25 11.43,5.08 13.97,5.08 15.24,6.35 ; 5.677,2.75 8.084,2.75 9.398,4.064 ; 5.677,3.25 7.822,3.25 8.89,4.318 8.89,5.842 10.668,7.62 13.97,7.62 15.24,8.89 ; 5.677,3.75 7.56,3.75 8.382,4.572 8.382,6.858 10.414,8.89 12.7,8.89 ; 12.7,6.35 11.684,6.35 9.398,4.064 ; -11.684,-6.35 -11.684,-6.35 ; 9.398,4.064 9.398,4.064 ; 12.7,1.27 12.7,1.27
Top Overlay:
  region: -6.82,-0.56 -7.074,-0.56 -7.074,-0.941 -6.82,-0.941
  region: -2.06,-6.82 -2.441,-6.82 -2.441,-7.074 -2.06,-7.074
  region: 2.94,-6.82 2.559,-6.82 2.559,-7.074 2.94,-7.074
  region: 6.82,-0.059 7.074,-0.059 7.074,-0.44 6.82,-0.44
  region: 3.441,6.82 3.06,6.82 3.06,7.074 3.441,7.074
  region: -1.559,6.82 -1.94,6.82 -1.94,7.074 -1.559,7.074
  lines w0.254: -5.182,-4.222 -5.182,-5.182 -4.222,-5.182 ; -5.182,4.222 -5.182,5.182 -4.222,5.182 ; 4.222,-5.182 5.182,-5.182 5.182,-4.222 ; 4.222,5.182 5.182,5.182 5.182,4.222 ; -16.51,-10.159 -11.43,-10.159 -11.43,10.16 -16.51,10.16 -16.51,-10.16 ; -16.51,-10.16 -16.51,-10.159 ; -10.159,16.51 -10.159,11.43 10.16,11.43 10.16,16.51 -10.16,16.51 ; -10.16,16.51 -10.159,16.51 ; 10.159,-16.51 10.159,-11.43 -10.16,-11.43 -10.16,-16.51 10.16,-16.51 ; 10.159,-16.51 10.16,-16.51 ; 16.51,10.159 11.43,10.159 11.43,-10.16 16.51,-10.16 16.51,10.16 ; 16.51,10.159 16.51,10.16 ; -16.51,-16.51 16.51,-16.51 16.51,16.51 -16.51,16.51 -16.51,-16.51
  text "*" at -7.62,5.08 h1.27
Mechanical 13:
  drawing of 261 lines, arcs and shapes, not listed
3D body "zl201-1_p2-54_l2-54_w2-54_h8-89.stp": height 8.89, standoff -3.05, extent -13.97,-7.62 -11.43,-5.08
3D body "zl201-1_p2-54_l2-54_w2-54_h8-89.stp": height 8.89, standoff -3.05, extent -13.97,-10.16 -11.43,-7.62
3D body "zl201-1_p2-54_l2-54_w2-54_h8-89.stp": height 8.89, standoff -3.05, extent -13.97,-5.08 -11.43,-2.54
3D body "zl201-1_p2-54_l2-54_w2-54_h8-89.stp": height 8.89, standoff -3.05, extent -13.97,-2.54 -11.43,0
3D body "zl201-1_p2-54_l2-54_w2-54_h8-89.stp": height 8.89, standoff -3.05, extent -13.97,0 -11.43,2.54
3D body "zl201-1_p2-54_l2-54_w2-54_h8-89.stp": height 8.89, standoff -3.05, extent -13.97,2.54 -11.43,5.08
3D body "zl201-1_p2-54_l2-54_w2-54_h8-89.stp": height 8.89, standoff -3.05, extent -16.51,-10.16 -13.97,-7.62
3D body "zl201-1_p2-54_l2-54_w2-54_h8-89.stp": height 8.89, standoff -3.05, extent -16.51,-7.62 -13.97,-5.08
3D body "zl201-1_p2-54_l2-54_w2-54_h8-89.stp": height 8.89, standoff -3.05, extent -16.51,-5.08 -13.97,-2.54
3D body "zl201-1_p2-54_l2-54_w2-54_h8-89.stp": height 8.89, standoff -3.05, extent -16.51,-2.54 -13.97,0
3D body "zl201-1_p2-54_l2-54_w2-54_h8-89.stp": height 8.89, standoff -3.05, extent -16.51,0 -13.97,2.54
3D body "zl201-1_p2-54_l2-54_w2-54_h8-89.stp": height 8.89, standoff -3.05, extent -16.51,2.541 -13.97,5.081
3D body "zl201-1_p2-54_l2-54_w2-54_h8-89.stp": height 8.89, standoff -3.05, extent -13.97,5.08 -11.43,7.62
3D body "zl201-1_p2-54_l2-54_w2-54_h8-89.stp": height 8.89, standoff -3.05, extent -16.51,5.08 -13.97,7.62
3D body "zl201-1_p2-54_l2-54_w2-54_h8-89.stp": height 8.89, standoff -3.05, extent -13.97,7.62 -11.43,10.16
3D body "zl201-1_p2-54_l2-54_w2-54_h8-89.stp": height 8.89, standoff -3.05, extent -16.51,7.62 -13.97,10.16
3D body "zl201-1_p2-54_l2-54_w2-54_h8-89.stp": height 8.89, standoff -3.05, extent 5.08,-13.97 7.62,-11.43
3D body "zl201-1_p2-54_l2-54_w2-54_h8-89.stp": height 8.89, standoff -3.05, extent 7.62,-13.97 10.16,-11.43
3D body "zl201-1_p2-54_l2-54_w2-54_h8-89.stp": height 8.89, standoff -3.05, extent 2.54,-13.97 5.08,-11.43
3D body "zl201-1_p2-54_l2-54_w2-54_h8-89.stp": height 8.89, standoff -3.05, extent 0,-13.97 2.54,-11.43
3D body "zl201-1_p2-54_l2-54_w2-54_h8-89.stp": height 8.89, standoff -3.05, extent -2.54,-13.97 0,-11.43
3D body "zl201-1_p2-54_l2-54_w2-54_h8-89.stp": height 8.89, standoff -3.05, extent -5.08,-13.97 -2.54,-11.43
3D body "zl201-1_p2-54_l2-54_w2-54_h8-89.stp": height 8.89, standoff -3.05, extent 7.62,-16.51 10.16,-13.97
3D body "zl201-1_p2-54_l2-54_w2-54_h8-89.stp": height 8.89, standoff -3.05, extent 5.08,-16.51 7.62,-13.97
3D body "zl201-1_p2-54_l2-54_w2-54_h8-89.stp": height 8.89, standoff -3.05, extent 2.54,-16.51 5.08,-13.97
3D body "zl201-1_p2-54_l2-54_w2-54_h8-89.stp": height 8.89, standoff -3.05, extent 0,-16.51 2.54,-13.97
3D body "zl201-1_p2-54_l2-54_w2-54_h8-89.stp": height 8.89, standoff -3.05, extent -2.54,-16.51 0,-13.97
3D body "zl201-1_p2-54_l2-54_w2-54_h8-89.stp": height 8.89, standoff -3.05, extent -5.081,-16.51 -2.541,-13.97
3D body "zl201-1_p2-54_l2-54_w2-54_h8-89.stp": height 8.89, standoff -3.05, extent -7.62,-13.97 -5.08,-11.43
3D body "zl201-1_p2-54_l2-54_w2-54_h8-89.stp": height 8.89, standoff -3.05, extent -7.62,-16.51 -5.08,-13.97
3D body "zl201-1_p2-54_l2-54_w2-54_h8-89.stp": height 8.89, standoff -3.05, extent -10.16,-13.97 -7.62,-11.43
3D body "zl201-1_p2-54_l2-54_w2-54_h8-89.stp": height 8.89, standoff -3.05, extent -10.16,-16.51 -7.62,-13.97
3D body "zl201-1_p2-54_l2-54_w2-54_h8-89.stp": height 8.89, standoff -3.05, extent 11.43,5.08 13.97,7.62
3D body "zl201-1_p2-54_l2-54_w2-54_h8-89.stp": height 8.89, standoff -3.05, extent 11.43,7.62 13.97,10.16
3D body "zl201-1_p2-54_l2-54_w2-54_h8-89.stp": height 8.89, standoff -3.05, extent 11.43,2.54 13.97,5.08
3D body "zl201-1_p2-54_l2-54_w2-54_h8-89.stp": height 8.89, standoff -3.05, extent 11.43,0 13.97,2.54
3D body "zl201-1_p2-54_l2-54_w2-54_h8-89.stp": height 8.89, standoff -3.05, extent 11.43,-2.54 13.97,0
3D body "zl201-1_p2-54_l2-54_w2-54_h8-89.stp": height 8.89, standoff -3.05, extent 11.43,-5.08 13.97,-2.54
3D body "zl201-1_p2-54_l2-54_w2-54_h8-89.stp": height 8.89, standoff -3.05, extent 13.97,7.62 16.51,10.16
3D body "zl201-1_p2-54_l2-54_w2-54_h8-89.stp": height 8.89, standoff -3.05, extent 13.97,5.08 16.51,7.62
3D body "zl201-1_p2-54_l2-54_w2-54_h8-89.stp": height 8.89, standoff -3.05, extent 13.97,2.54 16.51,5.08
3D body "zl201-1_p2-54_l2-54_w2-54_h8-89.stp": height 8.89, standoff -3.05, extent 13.97,0 16.51,2.54
3D body "zl201-1_p2-54_l2-54_w2-54_h8-89.stp": height 8.89, standoff -3.05, extent 13.97,-2.54 16.51,0
3D body "zl201-1_p2-54_l2-54_w2-54_h8-89.stp": height 8.89, standoff -3.05, extent 13.97,-5.081 16.51,-2.541
3D body "zl201-1_p2-54_l2-54_w2-54_h8-89.stp": height 8.89, standoff -3.05, extent 11.43,-7.62 13.97,-5.08
3D body "zl201-1_p2-54_l2-54_w2-54_h8-89.stp": height 8.89, standoff -3.05, extent 13.97,-7.62 16.51,-5.08
3D body "zl201-1_p2-54_l2-54_w2-54_h8-89.stp": height 8.89, standoff -3.05, extent 11.43,-10.16 13.97,-7.62
3D body "zl201-1_p2-54_l2-54_w2-54_h8-89.stp": height 8.89, standoff -3.05, extent 13.97,-10.16 16.51,-7.62
3D body "zl201-1_p2-54_l2-54_w2-54_h8-89.stp": height 8.89, standoff -3.05, extent -7.62,11.43 -5.08,13.97
3D body "zl201-1_p2-54_l2-54_w2-54_h8-89.stp": height 8.89, standoff -3.05, extent -10.16,11.43 -7.62,13.97
3D body "zl201-1_p2-54_l2-54_w2-54_h8-89.stp": height 8.89, standoff -3.05, extent -5.08,11.43 -2.54,13.97
3D body "zl201-1_p2-54_l2-54_w2-54_h8-89.stp": height 8.89, standoff -3.05, extent -2.54,11.43 0,13.97
3D body "zl201-1_p2-54_l2-54_w2-54_h8-89.stp": height 8.89, standoff -3.05, extent 0,11.43 2.54,13.97
3D body "zl201-1_p2-54_l2-54_w2-54_h8-89.stp": height 8.89, standoff -3.05, extent 2.54,11.43 5.08,13.97
3D body "zl201-1_p2-54_l2-54_w2-54_h8-89.stp": height 8.89, standoff -3.05, extent -10.16,13.97 -7.62,16.51
3D body "zl201-1_p2-54_l2-54_w2-54_h8-89.stp": height 8.89, standoff -3.05, extent -7.62,13.97 -5.08,16.51
3D body "zl201-1_p2-54_l2-54_w2-54_h8-89.stp": height 8.89, standoff -3.05, extent -5.08,13.97 -2.54,16.51
3D body "zl201-1_p2-54_l2-54_w2-54_h8-89.stp": height 8.89, standoff -3.05, extent -2.54,13.97 0,16.51
3D body "zl201-1_p2-54_l2-54_w2-54_h8-89.stp": height 8.89, standoff -3.05, extent 0,13.97 2.54,16.51
3D body "zl201-1_p2-54_l2-54_w2-54_h8-89.stp": height 8.89, standoff -3.05, extent 2.541,13.97 5.081,16.51
3D body "zl201-1_p2-54_l2-54_w2-54_h8-89.stp": height 8.89, standoff -3.05, extent 5.08,11.43 7.62,13.97
3D body "zl201-1_p2-54_l2-54_w2-54_h8-89.stp": height 8.89, standoff -3.05, extent 5.08,13.97 7.62,16.51
3D body "zl201-1_p2-54_l2-54_w2-54_h8-89.stp": height 8.89, standoff -3.05, extent 7.62,11.43 10.16,13.97
3D body "zl201-1_p2-54_l2-54_w2-54_h8-89.stp": height 8.89, standoff -3.05, extent 7.62,13.97 10.16,16.51
3D body: height 0.25, standoff 0, extent 0,0 0.254,0.254
3D body "LQFP-64-M.step": height 1.6, standoff 0, extent -6.007,-6.007 6.007,6.007